# Altium footprint library RDM_ALT_PCB.PcbLib: 127 footprints (part 3 of 8)
Each footprint in its own frame and in the unit in brackets; x right, y up, seen from the top. Pads: shape width x height; smd on the part's side, far side on the other; paste and mask are expansions set on the pad; w line width, h text height; cw(c..) or ccw(c..) is an arc to the next point about the centre after c.
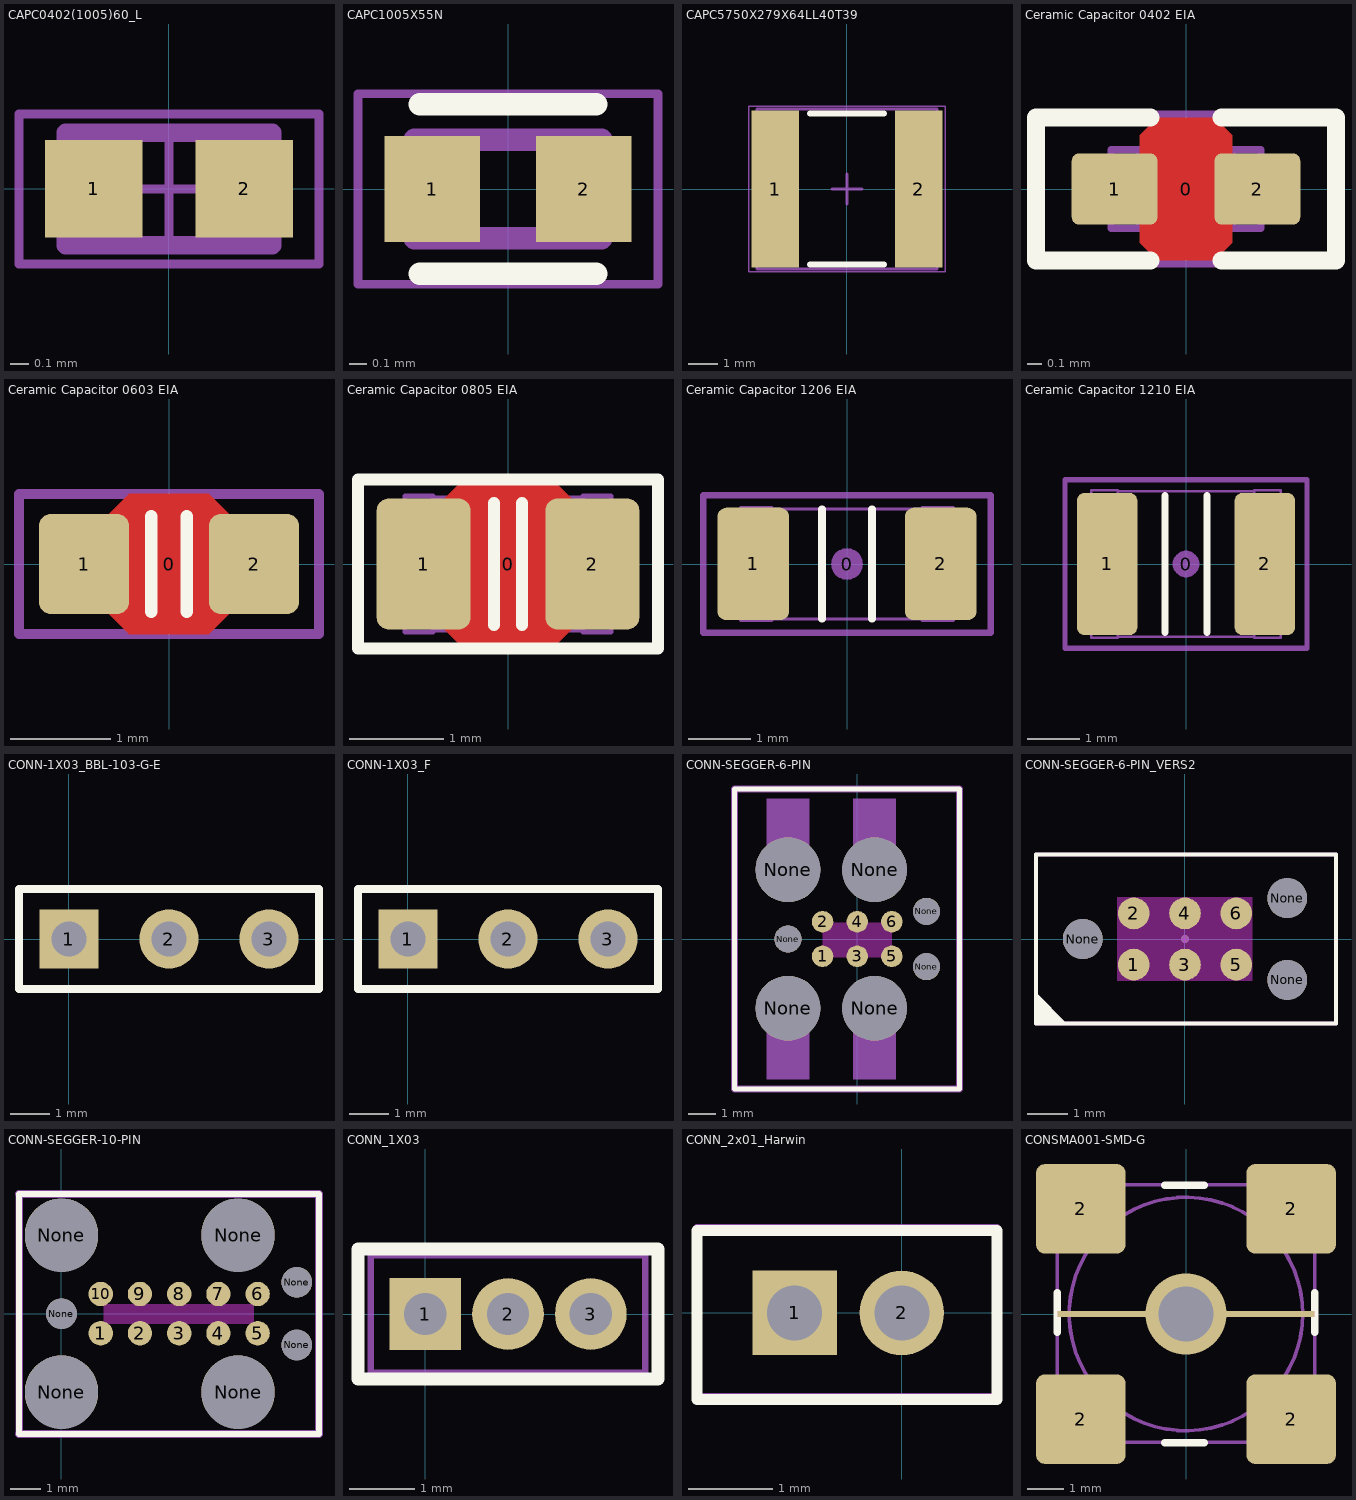
[diagram p2: the footprints below, top view; thin cyan lines are the x and y axes]

## CAPC0402(1005)60_L [mm] "Chip Capacitor, Body 1.0x0.5mm, Height 0.6mm, IPC High Density"
height 0.6
pads (2):
  rect 0.52x0.52 smd: 1(-0.4,0) 2(0.4,0)
Mechanical 13:
  lines w0.1: -0.55,-0.3 0.55,-0.3 0.55,0.3 -0.55,0.3 -0.55,-0.3
Mechanical 15:
  lines w0.05: -0.3,0 0.3,0 ; 0,-0.3 0,0.3 ; -0.8,-0.4 0.8,-0.4 0.8,0.4 -0.8,0.4 -0.8,-0.4
3D body: height 0.6, standoff 0, extent 0.3,-0.3 0.55,0.3
3D body: height 0.6, standoff 0, extent -0.55,-0.3 -0.3,0.3
3D body: height 0.6, standoff 0, extent -0.3,-0.3 0.3,0.3

## CAPC1005X55N [mm]
pads (2):
  rect 0.54x0.6 smd: 1(-0.43,0) 2(0.43,0)
Top Overlay:
  lines w0.127: -0.5,-0.48 0.5,-0.48 ; -0.5,0.48 0.5,0.48
Mechanical 4:
  lines w0.127: -0.53,-0.28 -0.53,0.28 ; -0.53,-0.28 0.53,-0.28 ; -0.53,-0.28 -0.53,0.28 ; -0.53,-0.28 0.53,-0.28 ; -0.53,0.28 0.53,0.28 ; -0.53,0.28 0.53,0.28 ; 0.53,-0.28 0.53,0.28 ; 0.53,-0.28 0.53,0.28
Mechanical 16:
  lines w0.05: -0.85,-0.54 -0.85,0.54 0.85,0.54 0.85,-0.54 -0.85,-0.54

## CAPC5750X279X64LL40T39 [mm] "Chip Capacitor, 2-Leads, Body 6.1x5.4mm, IPC High Density"
height 2.79
pads (2):
  rect 1.6x5.3 smd: 1(-2.425,0) 2(2.425,0)
Top Overlay:
  lines w0.2: -1.25,-2.55 1.25,-2.55 ; -1.25,2.55 1.25,2.55
Mechanical 13:
  lines w0.1: -3.05,-2.7 3.05,-2.7 3.05,2.7 -3.05,2.7 -3.05,-2.7
Mechanical 15:
  lines w0.05: -3.325,-2.8 -3.325,2.8 3.325,2.8 3.325,-2.8 -3.325,-2.8
  lines w0.1: -0.5,0 0.5,0 ; 0,-0.5 0,0.5
3D body: height 2.79, standoff 0, extent 2.41,-2.7 3.05,2.7
3D body: height 2.79, standoff 0, extent -3.05,-2.7 -2.41,2.7
3D body: height 2.79, standoff 0, extent -2.41,-2.7 2.41,2.7

## Ceramic Capacitor 0402 EIA [mm]
pads (3):
  round 0.2 on Mech15: 0(0,0)
  rrect20% 0.6x0.5 smd: 1(-0.5,0) 2(0.5,0)
Top Layer:
  pour cut-out: -0.325,0.375 -0.2,0.5 0.2,0.5 0.325,0.375 0.325,-0.375 0.2,-0.5 -0.2,-0.5 -0.325,-0.375
Top Overlay:
  lines w0.127: -0.25,-0.5 -1.05,-0.5 -1.05,0.5 -0.25,0.5 ; 0.25,-0.5 1.05,-0.5 1.05,0.5 0.25,0.5
Mechanical 13:
  lines w0.05: -0.325,-0.255 0.325,-0.255 ; -0.325,0.255 0.325,0.255 ; -0.525,-0.275 -0.325,-0.275 -0.325,0.275 -0.525,0.275 -0.525,-0.275 ; 0.325,-0.275 0.325,0.275 0.525,0.275 0.525,-0.275 0.325,-0.275
Mechanical 15:
  lines w0.1: -1.05,-0.5 1.05,-0.5 1.05,0.5 -1.05,0.5 -1.05,-0.5
3D body "CAP 0402 (1005 metric).STEP": height 0.55, standoff 0, extent -0.525,-0.275 0.525,0.275

## Ceramic Capacitor 0603 EIA [mm]
pads (3):
  round 0.254 on Mech15: 0(0,0)
  rrect25% 0.9x1 smd: 1(-0.85,0) 2(0.85,0)
Top Layer:
  pour cut-out: -0.6,0.5 -0.4,0.7 0.4,0.7 0.6,0.5 0.6,-0.5 0.4,-0.7 -0.4,-0.7 -0.6,-0.5
Top Overlay:
  lines w0.127: -0.178,-0.476 -0.178,0.476 ; 0.178,-0.476 0.178,0.476
Mechanical 13:
  lines w0.05: -0.55,-0.43 0.55,-0.43 ; -0.55,0.43 0.55,0.43 ; -0.85,-0.45 -0.55,-0.45 -0.55,0.45 -0.85,0.45 -0.85,-0.45 ; 0.55,-0.45 0.85,-0.45 0.85,0.45 0.55,0.45 0.55,-0.45
Mechanical 15:
  lines w0.1: -1.5,-0.7 1.5,-0.7 1.5,0.7 -1.5,0.7 -1.5,-0.7
3D body "CAP_0603.STEP": height 0.89, standoff -0.01, extent -0.85,-0.45 0.85,0.45

## Ceramic Capacitor 0805 EIA [mm]
pads (3):
  round 0.254 on Mech15: 0(0,0)
  rrect25% 1x1.4 smd: 1(-0.9,0) 2(0.9,0)
Top Layer:
  pour cut-out: -0.675,0.7 -0.475,0.9 0.475,0.9 0.675,0.7 0.675,-0.7 0.475,-0.9 -0.475,-0.9 -0.675,-0.7
Top Overlay:
  lines w0.126: -1.6,-0.9 -1.6,0.9 1.6,0.9 1.6,-0.9 -1.6,-0.9
  lines w0.127: -0.15,-0.651 -0.15,0.651 ; 0.15,-0.651 0.15,0.651
Mechanical 13:
  lines w0.05: -0.8,-0.705 0.8,-0.705 ; -0.8,0.705 0.8,0.705 ; -1.1,-0.725 -0.8,-0.725 -0.8,0.725 -1.1,0.725 -1.1,-0.725 ; 0.8,-0.725 0.8,0.725 1.1,0.725 1.1,-0.725 0.8,-0.725
Mechanical 15:
  lines w0.1: -1.6,-0.9 1.6,-0.9 1.6,0.9 -1.6,0.9 -1.6,-0.9
3D body "CAP_0805.STEP": height 1.34, standoff -0.01, extent -1.1,-0.725 1.1,0.725

## Ceramic Capacitor 1206 EIA [mm]
pads (3):
  round 0.508 on Mech15: 0(0,0)
  rrect25% 1.15x1.8 smd: 1(-1.5,0) 2(1.5,0)
Top Overlay:
  lines w0.127: -0.4,-0.876 -0.4,0.876 ; 0.4,-0.876 0.4,0.876
Mechanical 13:
  lines w0.05: -1.2,-0.88 1.2,-0.88 ; -1.2,0.88 1.2,0.88 ; -1.7,-0.9 -1.7,0.9 -1.2,0.9 -1.2,-0.9 -1.7,-0.9 ; 1.2,-0.9 1.2,0.9 1.7,0.9 1.7,-0.9 1.2,-0.9
Mechanical 15:
  lines w0.1: -2.3,-1.1 2.3,-1.1 2.3,1.1 -2.3,1.1 -2.3,-1.1
3D body "CAPC3216X100N - 1206 (3216 metric).STEP": height 1, standoff 0, extent -1.7,-0.9 1.7,0.9

## Ceramic Capacitor 1210 EIA [mm]
pads (3):
  round 0.508 on Mech15: 0(0,0)
  rrect25% 1.15x2.7 smd: 1(-1.5,0) 2(1.5,0)
Top Overlay:
  lines w0.127: -0.4,-1.3 -0.4,1.3 ; 0.4,-1.3 0.4,1.3
Mechanical 13:
  lines w0.05: -1.3,-1.38 1.3,-1.38 ; -1.3,1.38 1.3,1.38 ; -1.8,-1.4 -1.3,-1.4 -1.3,1.4 -1.8,1.4 -1.8,-1.4 ; 1.3,-1.4 1.3,1.4 1.8,1.4 1.8,-1.4 1.3,-1.4
Mechanical 15:
  lines w0.1: -2.3,-1.6 -2.3,1.6 2.3,1.6 2.3,-1.6 -2.3,-1.6
3D body "CAP_1210.STEP": height 2.19, standoff -0.01, extent -1.8,-1.4 1.8,1.4

## CONN-1X03_BBL-103-G-E [mm] "Headers & Wire Housings .100\" Low Profile Single Row, Screw Machine Terminal Strip"
height 1.78
pads (3):
  rect 1.5x1.5 hole 0.9: 1(0,0)
  round 1.5 hole 0.9: 2(2.54,0) 3(5.08,0)
Top Overlay:
  lines w0.2: -1.27,-1.27 -1.27,1.27 6.35,1.27 6.35,-1.27 -1.27,-1.27
Mechanical 13:
  lines w0.1: -1.27,-1.27 6.35,-1.27 6.35,1.27 -1.27,1.27 -1.27,-1.27
3D body "BBL-103-G-E.stp": height 4.01, standoff -3.38, extent -1.27,-1.219 6.35,1.219

## CONN-1X03_F [mm] "Connector; Header; 3 Position, Female"
pads (3):
  rect 1.5x1.5 hole 0.9: 1(0,0)
  round 1.5 hole 0.9: 2(2.54,0) 3(5.08,0)
Top Overlay:
  lines w0.2: -1.27,-1.27 6.35,-1.27 6.35,1.27 -1.27,1.27 -1.27,-1.27
Mechanical 13:
  lines w0.1: -1.27,-1.27 6.35,-1.27 6.35,1.27 -1.27,1.27 -1.27,-1.27
3D body "SL-103-G-12.stp": height 2.28, standoff -2.54, extent -1.27,-1.27 6.35,1.27

## CONN-SEGGER-6-PIN [mil] "J-Link 6-pin Needle Adapter"
pads (13):
  round 31 smd: 1(-50,-25) 2(-50,25) 3(0,-25) 4(0,25) 5(50,-25) 6(50,25)
  round 93.5 hole 93.5 unplated: None(-100,-100) None(-100,100) None(25,-100) None(25,100)
  round 39 hole 39 unplated: None(-100,0) None(100,-40) None(100,40)
Top Overlay:
  lines w7.87: -177.17,-216.54 147.64,-216.54 147.64,216.54 -177.17,216.54 -177.17,-216.54
Keep-Out Layer:
  region: -50,23.62 50,23.62 50,-26.38 -50,-26.38
Mechanical 4:
  region: -5.5,202.75 55.5,202.75 55.5,100 -5.5,100
  region: -130.5,202.75 -69.5,202.75 -69.5,100 -130.5,100
  region: -5.5,-100 55.5,-100 55.5,-202.75 -5.5,-202.75
  region: -130.5,-100 -69.5,-100 -69.5,-202.75 -130.5,-202.75
  region: -5.5,202.75 55.5,202.75 55.5,100 -5.5,100
  region: -130.5,202.75 -69.5,202.75 -69.5,100 -130.5,100
  region: -5.5,-100 55.5,-100 55.5,-202.75 -5.5,-202.75
  region: -130.5,-100 -69.5,-100 -69.5,-202.75 -130.5,-202.75
  region: -5.5,202.75 55.5,202.75 55.5,100 -5.5,100
  region: -130.5,202.75 -69.5,202.75 -69.5,100 -130.5,100
  region: -5.5,-100 55.5,-100 55.5,-202.75 -5.5,-202.75
  region: -130.5,-100 -69.5,-100 -69.5,-202.75 -130.5,-202.75
  region: -5.5,202.75 55.5,202.75 55.5,100 -5.5,100
  region: -130.5,202.75 -69.5,202.75 -69.5,100 -130.5,100
  region: -5.5,-100 55.5,-100 55.5,-202.75 -5.5,-202.75
  region: -130.5,-100 -69.5,-100 -69.5,-202.75 -130.5,-202.75
  region: -5.5,202.75 55.5,202.75 55.5,100 -5.5,100
  region: -130.5,202.75 -69.5,202.75 -69.5,100 -130.5,100
  region: -5.5,-100 55.5,-100 55.5,-202.75 -5.5,-202.75
  region: -130.5,-100 -69.5,-100 -69.5,-202.75 -130.5,-202.75
  region: -5.5,202.75 55.5,202.75 55.5,100 -5.5,100
  region: -130.5,202.75 -69.5,202.75 -69.5,100 -130.5,100
  region: -5.5,-100 55.5,-100 55.5,-202.75 -5.5,-202.75
  region: -130.5,-100 -69.5,-100 -69.5,-202.75 -130.5,-202.75
Mechanical 29 (Mech29):
  lines w10: -177.17,-216.54 -177.17,216.54 147.64,216.54 147.64,-216.54 -177.17,-216.54

## CONN-SEGGER-6-PIN_VERS2 [mil] "J-Link 6-pin Needle Adapter without holes for alignment"
pads (9):
  round 31 smd paste-30.98: 1(-50,-25) 2(-50,25) 3(0,-25) 4(0,25) 5(50,-25) 6(50,25)
  round 39 hole 39 unplated: None(-100,0) None(100,-40) None(100,40)
Top Layer keep-out:
  region: -66,41 66,41 66,-41 -66,-41
Top Overlay:
  region: -115.67,-82.68 -145.67,-82.68 -145.67,-52.68
  lines w3.94: -145.67,-82.68 147.64,-82.68 147.64,82.68 -145.67,82.68 -145.67,-82.68
Mechanical 15:
  circle w3.94: c0,0 r2
  lines w3.94: -145.67,-82.68 147.64,-82.68 147.64,82.68 -145.67,82.68 -145.67,-82.68

## CONN-SEGGER-10-PIN [mil] "J-Link 10-pin Needle Adapter"
pads (17):
  round 31 smd: 1(50,-25) 2(100,-25) 3(150,-25) 4(200,-25) 5(250,-25) 6(250,25) 7(200,25) 8(150,25) 9(100,25) 10(50,25)
  round 93.5 hole 93.5 unplated: None(0,-100) None(0,100) None(225,-100) None(225,100)
  round 39 hole 39 unplated: None(0,0) None(300,-39.96) None(300,39.96)
Top Layer keep-out:
  region: 54.13,11.81 245.08,11.81 245.08,-12.8 54.13,-12.8
Top Overlay:
  lines w7.87: -54.13,-153.54 -54.13,152.56 328.15,152.56 328.15,-153.54 -53.74,-153.54
Mechanical 29 (Mech29):
  lines w10: -54.13,-153.54 328.15,-153.54 328.15,152.56 -54.13,152.56 ; -53.74,-153.54 -53.74,152.56

## CONN_1X03 [mm] "Connector; Header; 3 Position"
pads (3):
  rect 1.1x1.1 hole 0.65: 1(0,0)
  round 1.1 hole 0.65: 2(1.27,0) 3(2.54,0)
Top Overlay:
  lines w0.2: -1.03,-1 3.57,-1 3.57,1 -1.03,1 -1.03,-1
Mechanical 13:
  lines w0.1: -0.835,-0.9 -0.835,0.9 3.375,0.9 3.375,-0.9 -0.835,-0.9 ; -0.25,-0.075 0.25,-0.075 0.25,0.075 -0.25,0.075 -0.25,-0.075 ; 1.02,-0.075 1.52,-0.075 1.52,0.075 1.02,0.075 1.02,-0.075 ; 2.29,-0.075 2.79,-0.075 2.79,0.075 2.29,0.075 2.29,-0.075
Mechanical 15:
  lines w0.01: -0.25,0.075 0.25,-0.075 ; 1.02,0.075 1.52,-0.075 ; 2.29,0.075 2.79,-0.075
3D body: height 0, standoff -2.25, extent 2.29,-0.075 2.79,0.075
3D body: height 0, standoff -2.25, extent 1.02,-0.075 1.52,0.075
3D body: height 0, standoff -2.25, extent -0.25,-0.075 0.25,0.075
3D body: height 4.4, standoff 0.15, extent -0.835,-0.9 3.375,0.9

## CONN_2x01_Harwin [mm] "Connector Header, vertical, 2 Pos, Pitch 1.27mm"
pads (2):
  rect 1x1 hole 0.65: 1(-1.27,0)
  round 1 hole 0.65: 2(0,0)
Top Overlay:
  lines w0.127: -2.425,-1.025 -2.425,0.975 1.125,0.975 1.125,-1.025 -2.425,-1.025
Mechanical 13:
  lines w0.1: -2.425,-1 1.125,-1 1.125,1 -2.425,1 -2.425,-1 ; -1.47,-0.2 -1.07,-0.2 -1.07,0.2 -1.47,0.2 -1.47,-0.2 ; -0.2,-0.2 -0.2,0.2 0.2,0.2 0.2,-0.2 -0.2,-0.2
Mechanical 15:
  lines w0.01: -1.52,0.075 -1.02,-0.075 ; -0.25,0.075 0.25,-0.075
  lines w0.1: -2.425,-1 -2.425,0.975 1.125,0.975 ; -2.4,-1.025 1.125,-1.025 ; 1.126,-1.024 1.126,0.974
3D body: height 5.3, standoff -3.3, extent -1.47,-0.2 -1.07,0.2
3D body: height 5.3, standoff -3.3, extent -0.2,-0.2 0.2,0.2
3D body "14357.stp": height 5.06, standoff 0.01, extent -2.6,-0.95 1.3,0.95
3D body: height 0, standoff -1, extent -2.426,-1.05 1.126,1.05

## CONSMA001-SMD-G [mm]
pads (5):
  rect 7x0.15 smd: 1(0,0)
  rrect20% 2.44x2.44 smd: 2(-2.86,-2.86) 2(-2.86,2.86) 2(2.86,-2.86) 2(2.86,2.86)
via 0,0 diameter 2.2 hole 1.5
Top Overlay:
  lines w0.2: -3.5,-0.5 -3.5,0.58 ; -0.58,-3.5 0.5,-3.5 ; -0.58,3.5 0.5,3.5 ; 3.5,-0.5 3.5,0.58
Mechanical 13:
  circle w0.1: c0,0 r3.175
  lines w0.1: -3.5,2.013 -2,2.013 -2,3.513 ; 2,3.513 2,2.013 3.5,2.013 ; 3.5,-1.987 2,-1.987 2,-3.487 -2,-3.487 -2,-1.987 -3.5,-1.987 -3.5,-3.487 ; -3.5,-3.487 3.5,-3.487 3.5,3.513 -3.5,3.513 -3.5,-3.487
3D body "SMA-J-P-H-ST-MT1.stp": height 10.55, standoff 0, extent -3.175,-3.175 3.175,3.175